# Altium footprint library self_pcblib.PcbLib: 94 footprints (part 5 of 6)
Each footprint in its own frame and in the unit in brackets; x right, y up, seen from the top. Pads: shape width x height; smd on the part's side, far side on the other; paste and mask are expansions set on the pad; w line width, h text height; cw(c..) or ccw(c..) is an arc to the next point about the centre after c.
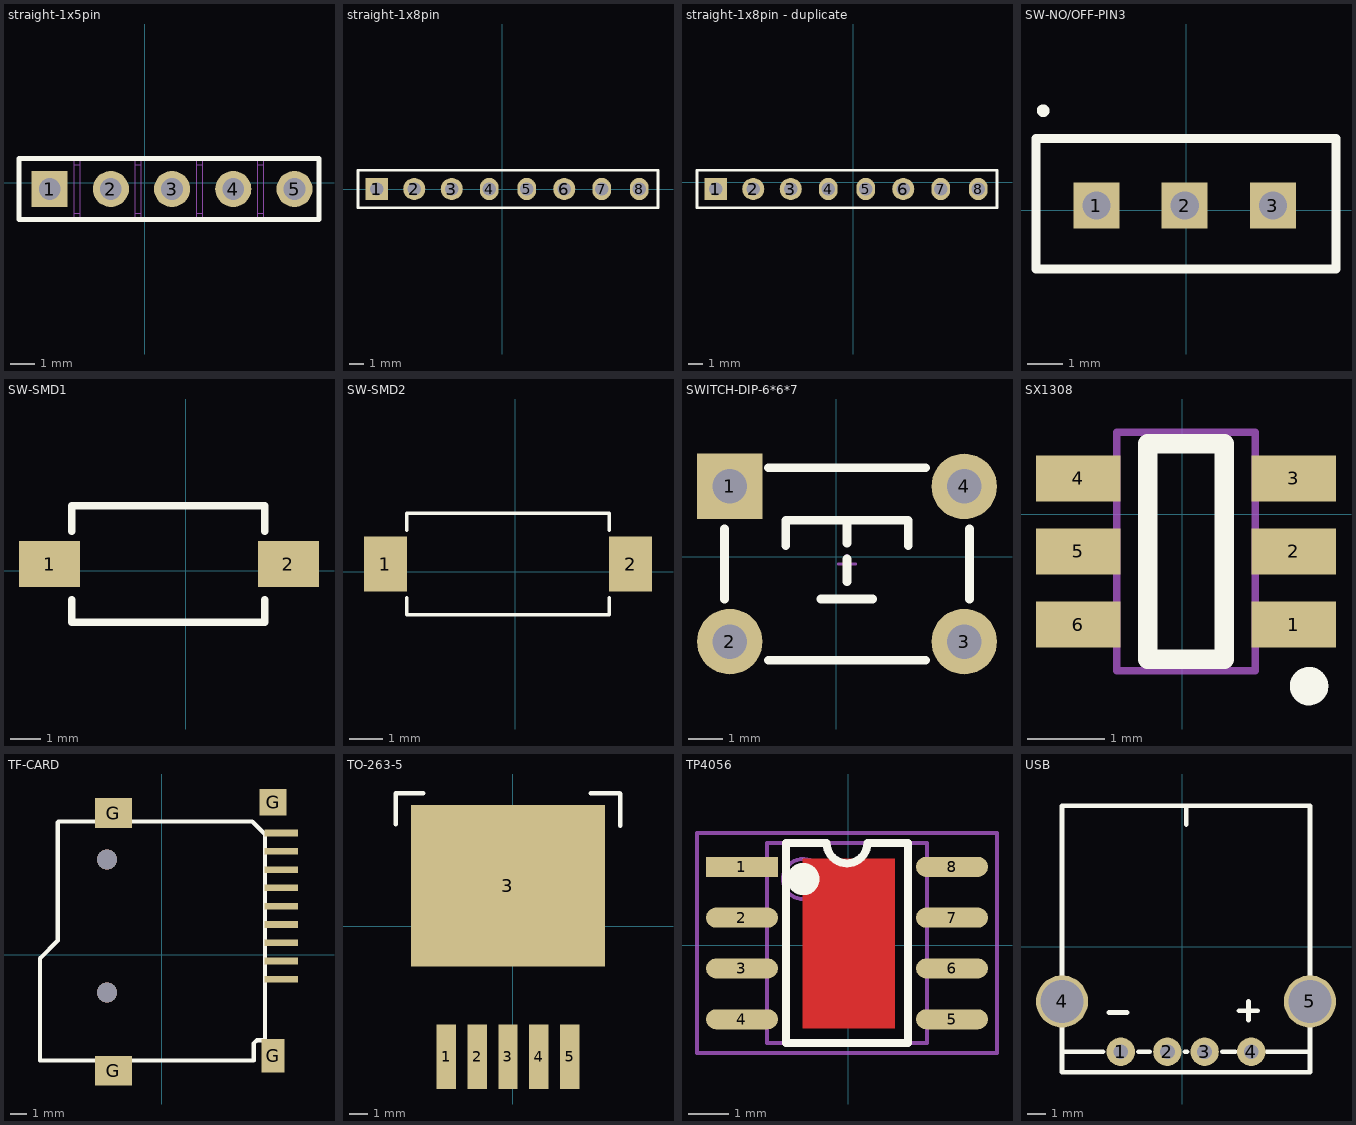
[diagram p4: the footprints below, top view; thin cyan lines are the x and y axes]

## straight-1x5pin [mm]
pads (5):
  rect 1.5x1.5 hole 0.9: 1(-3.937,-0.254)
  round 1.5 hole 0.9: 2(-1.397,-0.254) 3(1.143,-0.254) 4(3.683,-0.254) 5(6.223,-0.254)
Top Overlay:
  lines w0.2: -5.207,-1.524 7.239,-1.524 7.239,1.016 -3.302,1.016 -5.207,1.016 -5.207,-1.524
Mechanical 1:
  lines w0.05: -2.921,-1.27 -2.667,-1.27 ; -2.921,0.762 -2.667,0.762 ; -0.381,-1.27 -0.127,-1.27 ; -0.381,0.762 -0.127,0.762 ; 2.159,-1.27 2.413,-1.27 ; 2.159,0.762 2.413,0.762 ; 4.699,-1.27 4.953,-1.27 ; 4.699,0.762 4.953,0.762 ; 7.239,-1.524 4.953,-1.524 4.953,1.016 7.239,1.016 ; -5.207,-1.524 -5.207,1.016 -2.921,1.016 -2.921,-1.524 -5.207,-1.524 ; -2.667,-1.524 -0.381,-1.524 -0.381,1.016 -2.667,1.016 -2.667,-1.524 ; -0.127,-1.524 2.159,-1.524 2.159,1.016 -0.127,1.016 -0.127,-1.524 ; 2.413,-1.524 4.699,-1.524 4.699,1.016 2.413,1.016 2.413,-1.524
3D body: height 4, standoff 0, extent -4.284,-0.603 -3.587,0.096
3D body: height 4, standoff 0, extent -1.744,-0.603 -1.047,0.096
3D body: height 4, standoff 0, extent 0.796,-0.603 1.493,0.096
3D body: height 4, standoff 0, extent 3.336,-0.603 4.033,0.096
3D body: height 4, standoff 0, extent 5.876,-0.603 6.573,0.095
3D body: height 4, standoff 0, extent 5.876,-0.603 6.573,0.096
3D body: height 4, standoff 0, extent 3.336,-0.603 4.033,0.096
3D body: height 4, standoff 0, extent 0.796,-0.603 1.493,0.096
3D body: height 4, standoff 0, extent -1.744,-0.603 -1.047,0.096
3D body: height 4, standoff 0, extent -4.284,-0.603 -3.587,0.095
3D body: height 1.5, standoff 0.2, extent 4.699,-1.27 4.953,0.762
3D body: height 1.5, standoff 0.2, extent 2.159,-1.27 2.413,0.762
3D body: height 1.5, standoff 0.2, extent -0.381,-1.27 -0.127,0.762
3D body: height 1.5, standoff 0.2, extent -2.921,-1.27 -2.667,0.762
3D body: height 1.7, standoff 0.2, extent 4.953,-1.524 7.239,1.016
3D body: height 1.7, standoff 0.2, extent 2.413,-1.524 4.699,1.016
3D body: height 1.7, standoff 0.2, extent -0.127,-1.524 2.159,1.016
3D body: height 1.7, standoff 0.2, extent -2.667,-1.524 -0.381,1.016
3D body: height 1.7, standoff 0.2, extent -5.207,-1.524 -2.921,1.016

## straight-1x8pin [mm]
pads (8):
  rect 1.5x1.5 hole 0.9: 1(-8.509,0)
  round 1.5 hole 0.9: 2(-5.969,0) 3(-3.429,0) 6(4.191,0)
  oval 1.27x1.5 hole 0.9: 4(-0.889,0) 5(1.651,0) 7(6.731,0) 8(9.271,0)
Top Overlay:
  lines w0.2: -9.779,-1.27 10.541,-1.27 10.541,1.27 -9.779,1.27 -9.779,-1.27
3D body: height 0.7, standoff -10.9, extent -9.779,-1.27 10.541,1.27

## straight-1x8pin - duplicate [mm]
pads (8):
  rect 1.5x1.5 hole 0.9: 1(-9.296,-0.457)
  round 1.5 hole 0.9: 2(-6.756,-0.457) 3(-4.216,-0.457) 6(3.404,-0.457)
  oval 1.27x1.5 hole 0.9: 4(-1.676,-0.457) 5(0.864,-0.457) 7(5.944,-0.457) 8(8.484,-0.457)
Top Overlay:
  lines w0.2: -10.566,-1.727 9.754,-1.727 9.754,0.813 -10.566,0.813 -10.566,-1.727
3D body: height 7.27, standoff -4.27, extent -10.643,-1.753 9.677,0.787

## straight-2x2pin [mm]

## straight-2x3pin [mm]

## straight-2x4pin [mm]

## straight-2x5pin [mm]

## SW-NO/OFF-PIN3 [mm]
pads (3):
  rect 1.3x1.3 hole 0.8: 1(-2.547,0.126) 2(-0.047,0.126) 3(2.453,0.126)
Top Overlay:
  circle w0.254: c-4.057,2.814 r0.051
  lines w0.254: -4.26,-1.673 -4.26,2.027 4.24,2.027 4.24,-1.673 -4.26,-1.673
3D body: height 4.32, standoff -9.73, extent -5.39,-2.672 5.608,2.916

## SW-SMD1 [mm]
pads (2):
  rect 2x1.5 smd: 1(-4.445,0.229) 2(3.355,0.229)
Top Overlay:
  lines w0.254: -3.72,-0.94 -3.72,-1.671 2.58,-1.671 2.58,-0.94 ; -3.72,1.295 -3.72,2.129 2.58,2.129 2.58,1.295
3D body: height 2.5, standoff 0, extent -4.504,-1.716 3.386,2.134

## SW-SMD2 [mm]
pads (2):
  rect 1.3x1.651 smd: 1(-3.901,0.235) 2(3.465,0.235)
Top Overlay:
  lines w0.1: -3.266,-0.781 -3.266,-1.289 2.83,-1.289 2.83,-0.781 ; -3.266,1.251 -3.266,1.759 2.83,1.759 2.83,1.251
3D body: height 1.9, standoff 0, extent -3.518,-1.314 3.082,1.886

## SWITCH-DIP-6*6*7 [mm]
pads (4):
  rect 1.9x1.9 hole 1: 1(-3.095,2.047)
  round 1.9 hole 1: 2(-3.095,-2.453) 3(3.705,-2.453) 4(3.705,2.047)
Top Overlay:
  lines w0.254: -3.251,-1.219 -3.251,0.813 ; -1.981,-2.997 2.591,-2.997 ; -1.981,2.591 2.591,2.591 ; -1.473,0.33 -1.473,1.067 2.083,1.067 2.083,0.33 ; -0.457,-1.219 1.041,-1.219 ; 0.305,-0.711 0.305,-0.051 ; 0.305,0.406 0.305,1.067 ; 3.861,-1.219 3.861,0.813
Bottom Overlay:
  lines w0.254: -1.981,-2.489 2.591,-2.489 ; -1.981,2.083 2.591,2.083
Mechanical 15:
  lines w0.076: 0.051,-0.203 0.559,-0.203 ; 0.305,-0.457 0.305,0.051
3D body: height 6.95, standoff -3.45, extent -3.801,-3.203 4.411,2.797

## SX1308 [mm]
pads (6):
  rect 1.1x0.6 smd: 1(1.451,-1.433) 2(1.451,-0.483) 3(1.451,0.467) 4(-1.349,0.467) 5(-1.349,-0.483) 6(-1.349,-1.433)
Top Overlay:
  circle w0.25: c1.651,-2.233 r0.125
  lines w0.254: -0.449,-1.883 0.551,-1.883 0.551,0.917 -0.449,0.917 -0.449,-1.883
Mechanical 13:
  lines w0.1: -0.849,-2.033 0.951,-2.033 0.951,1.067 -0.849,1.067 -0.849,-2.033
3D body: height 1, standoff -0.1, extent -1.155,-1.933 1.245,0.967

## TF-CARD [mm]
pads (13):
  rect 2x0.4 smd: 1(7.191,-1.488) 2(7.191,-0.388) 3(7.191,0.712) 4(7.191,1.812) 5(7.191,2.912) 6(7.191,4.012) 7(7.191,5.112) 8(7.191,6.212) 9(7.191,7.312)
  rect 2.2x1.8 smd: G(-2.909,-6.988) G(-2.909,8.512)
  rect 1.4x2 smd: G(6.691,-6.088)
  rect 1.6x1.6 smd: G(6.691,9.162)
via -3.309,-2.288 diameter 1.2 hole 1.2
via -3.309,5.712 diameter 1.2 hole 1.2
Top Overlay:
  lines w0.254: -7.329,-6.368 -7.329,-0.226 -6.262,0.841 -6.262,7.953 -6.214,8.001 5.443,8.001 6.205,7.239 6.205,7.112 6.205,-5.153 5.727,-5.153 5.524,-5.356 5.524,-6.372 -7.325,-6.372
3D body: height 0.1, standoff -2.37, extent -7.227,-7.269 7.983,9.037

## TO-263-5 [mil]
pads (6):
  rect 42x140 smd: 1(-144.6,-282.2) 2(-77.6,-282.2) 3(-10.6,-282.2) 4(56.4,-282.2) 5(123.4,-282.2)
  rect 420x350 smd: 3(-10.6,87.8)
Top Overlay:
  lines w10: -253.6,221.8 -253.6,288.8 -194.6,288.8 ; 168.4,288.8 231.4,288.8 232.4,287.8 232.4,217.8
3D body: height 179.92, standoff -0.39, extent -210.6,-315.41 189.4,261.01

## TP4056 [mm]
pads (8):
  rect 1.8x0.5 smd: 1(-2.65,1.956)
  oval 1.8x0.5 smd: 2(-2.65,0.686) 3(-2.65,-0.584) 4(-2.65,-1.854) 5(2.6,-1.854) 6(2.6,-0.584) 7(2.6,0.686) 8(2.6,1.956)
Top Layer:
  rectangle: -1.143,-2.083 1.168,2.159
Top Overlay:
  circle w0.5: c-1.12,1.651 r0.155
  lines w0.2: -1.549,2.551 -1.549,-2.449 1.499,-2.449 1.499,2.551
  lines w0.203: -1.549,2.551 -0.533,2.551 ccw(c-0.025,2.551) -0.025,2.043 ccw(c-0.025,2.551) 0.483,2.551 1.499,2.551
Mechanical 13:
  circle w0.1: c-1.125,1.651 r0.5
  lines w0.1: -2.025,-2.449 -2.025,2.551 1.975,2.551 1.975,-2.449 -2.025,-2.449
Mechanical 15:
  circle w0.05: c-0.025,0.051 r0.35
  lines w0.05: -0.525,0.051 0.475,0.051 ; -0.025,-0.449 -0.025,0.551
  lines w0.1: -3.775,-2.699 -3.775,2.801 3.725,2.801 3.725,-2.699 -3.775,-2.699
3D body: height 1.9, standoff 0, extent -3.029,-2.449 2.978,2.551

## USB [mil]
pads (6):
  round 60 hole 31.5: 1(-129.61,-221.3) 2(-31.18,-221.3) 3(47.56,-221.3) 4(145.98,-221.3)
  round 110.24 hole 90.55: 4(-253.62,-115) 5(270,-115)
Top Overlay:
  lines w10: -253.62,-221.3 -167.01,-221.3 ; -155.2,-138.62 -115.83,-138.62 ; -92.2,-221.3 -68.58,-221.3 ; 6.22,-221.3 10.16,-221.3 ; 8.58,259.02 8.58,298.39 ; 84.96,-221.3 112.52,-221.3 ; 120.39,-134.68 159.76,-134.68 ; 140.08,-154.37 140.08,-115 ; 179.45,-221.3 270,-221.3 ; -253.62,-264.61 270,-264.61 270,298.39 -253.62,298.39 -253.62,-264.61
3D body: height 297.24, standoff -129.92, extent -302.64,-264.61 319.39,292.87